# Altium schematic symbol library Minh_Lib.SchLib: 619 symbols (part 1 of 4) (continued)
## C0603C689J5GACTU (continued)
CAP CER 6.8PF 50V C0G/NP0 0603; Manufacturer 1: KEMET; Manufacturer Part Number 1: C0603C689J5GACTU; Category 1: Capacitors; Tolerance: ±5%; Temperature Coefficient: C0G, NP0; Supplier 1: Digi-Key; Supplier Part Number 1: 399-7957-1-ND; RoHS 1: RoHS Compliant; Description 1: CAP CER 6.8PF 50V C0G/NP0 0603; Stock 1: 34264; Pricing 1: 1=0.37, 10=0.25, 100=0.1419, 500=0.10018, 1000=0.08766 (USD); Packaging: Cut Tape (CT); Part Status: Active; Capacitance: 6.8pF; Voltage - Rated: 50V; Operating Temperature: -55°C ~ 125°C; Features: Low ESL; Ratings: -; Applications: General Purpose; Failure Rate: -; Mounting Type: Surface Mount, MLCC; Package / Case: 0603 (1608 Metric); Size / Dimension: 0.063" L x 0.031" W (1.60mm x 0.80mm); Height - Seated (Max): -; Thickness (Max): 0.034" (0.87mm); Lead Spacing: -; Lead Style: -; ComponentLink1URL: http://www.kemet.com/docfinder?Partnumber=C0603C689J5GACTU; ComponentLink1Description: http://www.kemet.com/docfinder?Partnumber=C0603C689J5GACTU; Value: 6.8pF
footprint CAP0603
pins: 1, 2

## C0805C102F4GACTU
designator C?  Supplier Part Number 1: 32X7567
Cap Cer 1000PF 16V NP0 0805 1%; Manufacturer: KEMET; Manufacturer Part Number: C0805C102F4GACTU; Dielectric Material: Ceramic; Capacitance: 1nF; Supplier 1: Newark; RoHS: Yes; Category: Ceramic Capacitors; Pricing 1: 4000=0.41500 (USD); Mount: Surface Mount; Case/Package: 0805; Min Operating Temperature: -55°C; Max Operating Temperature: 125°C; Package Quantity: 4000; Voltage Rating: 16V; Tolerance: 1%; Packaging: Tape and Reel; Voltage Rating (DC): 16V; Length: 0.079inch; Width: 0.049inch; Thickness: 0.035inch; Lead Free: Lead Free; RoHS Compliant: Yes; ComponentLink1URL: https://search.kemet.com/component-edge/download/datasheet/C0805C102F4GACTU.pdf?src-supplier=Digi-Key; ComponentLink1Description: https://search.kemet.com/component-edge/download/datasheet/C0805C102F4GACTU.pdf?src-supplier=Digi-Key
footprint CAP0805
pins: 1, 2

## C0805C102J3RACTU
designator C?  Supplier Part Number 1: 82AC2499
Cap Ceramic 0.001uF 25V X7R 5% SMD 0805 125°C Paper T/R; Manufacturer: KEMET; Manufacturer Part Number: C0805C102J3RACTU; Capacitance: 1nF; Dissipation Factor: 3.5%; Supplier 1: Newark; RoHS: Yes; Category: Ceramic Capacitors; Stock 1: 10688; Pricing 1: 10=0.27200, 25=0.23600, 50=0.19900, 100=0.16300 (USD); Mount: Surface Mount; Case/Package: 0805; Dielectric Material: Ceramic; Case Code (Metric): 2012; Case Code (Imperial): 0805; Min Operating Temperature: -55°C; Max Operating Temperature: 125°C; Tolerance: 5%; Voltage Rating: 25V; Packaging: Tape and Reel; Voltage Rating (DC): 25V; Dielectric: X7R; Series: C; Package Quantity: 4000; Termination: SMD/SMT; Length: 0.079inch; Width: 0.049inch; Height: 0.78mm; Depth: 1.25mm; Thickness: 0.035inch; Lead Pitch: 0.75mm; RoHS Compliant: Yes; ComponentLink1URL: https://datasheet.ciiva.com/5422/kem-c1002-x7r-smd-5422190.pdf?src-supplier=Mouser; ComponentLink1Description: https://datasheet.ciiva.com/5422/kem-c1002-x7r-smd-5422190.pdf?src-supplier=Mouser
footprint CAP0805
pins: 1, 2

## C0805C102J4GACTU
designator C?  Supplier Part Number 1: 96Y7103
Cap Ceramic 0.001uF/1NF/1000PF 16V C0G 5% SMD 0805 125°C Paper T/R; Manufacturer: KEMET; Manufacturer Part Number: C0805C102J4GACTU; Capacitance: 1nF; Supplier 1: Newark; RoHS: Yes; Category: Ceramic Capacitors; Stock 1: 645; Pricing 1: 1=0.32000, 25=0.18500, 50=0.14900, 100=0.11200, 250=0.10700, 500=0.10100 (USD); Mount: Surface Mount; Case/Package: 0805; Case Code (Metric): 2012; Case Code (Imperial): 0805; Dielectric Material: Ceramic; Min Operating Temperature: -55°C; Max Operating Temperature: 125°C; Package Quantity: 1; Voltage Rating: 16V; Tolerance: 5%; Packaging: Tape and Reel; Voltage Rating (DC): 16V; Termination: SMD/SMT; Series: C; Length: 0.079inch; Width: 0.049inch; Thickness: 0.035inch; Lead Free: Lead Free; RoHS Compliant: Yes; ComponentLink1URL: https://datasheet.ciiva.com/5416/kem-c1003-c0g-smd-5416796.pdf?src-supplier=Mouser; ComponentLink1Description: https://datasheet.ciiva.com/5416/kem-c1003-c0g-smd-5416796.pdf?src-supplier=Mouser
footprint CAP0805
pins: 1, 2

## C0805C102J5RACTU
designator C?  Supplier Part Number 1: 36X2687
Multilayer Ceramic Capacitor, C Series,50 V, 1000 pF, - 5%, X7R, 0805 [2012 Metric] ; RoHS Compliant: Yes; Manufacturer: KEMET; Manufacturer Part Number: C0805C102J5RACTU; Capacitance: 1nF; Voltage Rating (DC): 50V; Dissipation Factor: 2.5%; Supplier 1: Newark; RoHS: Yes; Category: Ceramic Capacitors; Stock 1: 16000; Pricing 1: 4000=0.01700, 8000=0.01600 (USD); Mount: Surface Mount,PCB; Case/Package: 0805; Dielectric Material: Ceramic; Case Code (Imperial): 0805; Case Code (Metric): 2012; Min Operating Temperature: -55°C; Max Operating Temperature: 125°C; Tolerance: 5%; Packaging: Tape and Reel; Dielectric: X7R; Package Quantity: 4000; Voltage Rating: 50V; Series: C0805C; Termination: SMD/SMT; Construction: Flat; Voltage: 50V; Length: 2mm; Height: 0.78mm; Depth: 1.25mm; Lead Pitch: 0.75mm; Radiation Hardening: No; REACH SVHC: No SVHC; ComponentLink1URL: https://datasheet.ciiva.com/26847/getdatasheetpartid-304388-26847781.pdf?src-supplier=Verical; ComponentLink1Description: https://datasheet.ciiva.com/26847/getdatasheetpartid-304388-26847781.pdf?src-supplier=Verical; ComponentLink2URL: https://datasheet.ciiva.com/7842/kem-c1002-x7r-smd-7842522.pdf?src-supplier=Element14; ComponentLink2Description: https://datasheet.ciiva.com/7842/kem-c1002-x7r-smd-7842522.pdf?src-supplier=Element14; ComponentLink3URL: https://datasheet.ciiva.com/28672/1851736-28672797.pdf?src-supplier=Element14; ComponentLink3Description: https://datasheet.ciiva.com/28672/1851736-28672797.pdf?src-supplier=Element14
footprint CAP0805
pins: 1, 2

## C0805C102J8HACAUTO
designator C?  Supplier Part Number 1: 80-C0805C102J8HAUTO
Cap Cer 0805 1NF 10V 5% Ultra Stabl; Manufacturer: KEMET; Manufacturer Part Number: C0805C102J8HACAUTO; Supplier 1: Mouser; RoHS: Yes; Category: Ceramic Capacitors; Pricing 1: 1=0.16000, 10=0.11000, 50=0.11000, 100=0.05200, 1000=0.03000, 10000=0.02300 (USD); RoHS Compliant: Yes
footprint CAP0805
pins: 1, 2

## C0805C102K3GACTU
designator C?  Supplier Part Number 1: 80-C0805C102K3G
Cap Ceramic 0.001uF 25V C0G 10% Pad SMD 0805 125C Extreme Low ESR T/R; Manufacturer: KEMET; Manufacturer Part Number: C0805C102K3GACTU; Capacitance: 1nF; Dissipation Factor: 0.1%; Supplier 1: Mouser; RoHS: Yes; Category: Ceramic Capacitors; Stock 1: 2400; Pricing 1: 1=0.38000, 10=0.20600, 50=0.20600, 100=0.12000, 1000=0.10000, 10000=0.08000 (USD); Mount: Surface Mount; Case/Package: 0805; Case Code (Imperial): 0805; Case Code (Metric): 2012; Dielectric Material: Ceramic; Min Operating Temperature: -55°C; Max Operating Temperature: 125°C; Tolerance: 10%; Packaging: Tape and Reel; Package Quantity: 4000; Voltage Rating: 25V; Voltage Rating (DC): 25V; Dielectric: C0G; Termination: SMD/SMT; Series: C; Length: 2mm; Width: 1.2mm; Height: 0.78mm; Thickness: 0.035inch; Depth: 1.25mm; Lead Free: Lead Free; RoHS Compliant: Yes; ComponentLink1URL: https://datasheet.ciiva.com/5414/kem-c1003-c0g-smd-356956-5414092.pdf?src-supplier=Mouser; ComponentLink1Description: https://datasheet.ciiva.com/5414/kem-c1003-c0g-smd-356956-5414092.pdf?src-supplier=Mouser
footprint CAP0805
pins: 1, 2

## C0805C102K4RACTU
designator C?  Supplier Part Number 1: 78H9956
Cap Ceramic 0.001uF 16V X7R 10% SMD 0805 125°C Paper T/R; Manufacturer: KEMET; Manufacturer Part Number: C0805C102K4RACTU; Capacitance: 1nF; Dissipation Factor: 5%; Supplier 1: Newark; RoHS: Yes; Category: Ceramic Capacitors; Stock 1: 4000; Pricing 1: 12000=0.00500 (USD); Mount: Surface Mount; Case/Package: 0805; Case Code (Metric): 2012; Case Code (Imperial): 0805; Dielectric Material: Ceramic; Min Operating Temperature: -55°C; Max Operating Temperature: 125°C; Package Quantity: 1; Voltage Rating: 16V; Tolerance: 10%; Packaging: Tape and Reel; Voltage Rating (DC): 16V; Dielectric: X7R; Termination: SMD/SMT; Series: C; Length: 2mm; Width: 0.049inch; Height: 0.78mm; Thickness: 0.035inch; Lead Pitch: 0.75mm; Depth: 1.25mm; REACH SVHC: No SVHC; RoHS Compliant: Yes; ComponentLink1URL: http://www.farnell.com/datasheets/2746322.pdf?src-supplier=Farnell; ComponentLink1Description: http://www.farnell.com/datasheets/2746322.pdf?src-supplier=Farnell; ComponentLink2URL: http://www.mouser.com/ds/2/212/KEM_C1002_X7R_SMD-1102033.pdf?src-supplier=Mouser; ComponentLink2Description: http://www.mouser.com/ds/2/212/KEM_C1002_X7R_SMD-1102033.pdf?src-supplier=Mouser; ComponentLink3URL: http://components.arrow.com/part/dataview/0323_00324120?src-supplier=Arrow+Europe; ComponentLink3Description: http://components.arrow.com/part/dataview/0323_00324120?src-supplier=Arrow+Europe; ComponentLink4URL: http://www.farnell.com/datasheets/1828800.pdf?src-supplier=Newark; ComponentLink4Description: http://www.farnell.com/datasheets/1828800.pdf?src-supplier=Newark; ComponentLink5URL: https://api.kemet.com/component-edge/download/datasheet/C0805C102K4RACTU.pdf?src-supplier=Digi-Key; ComponentLink5Description: https://api.kemet.com/component-edge/download/datasheet/C0805C102K4RACTU.pdf?src-supplier=Digi-Key; ComponentLink6URL: http://www.farnell.com/datasheets/2746322.pdf?src-supplier=Newark; ComponentLink6Description: http://www.farnell.com/datasheets/2746322.pdf?src-supplier=Newark; ComponentLink7URL: http://capacitoredge.kemet.com/capedge2/DataSheet?pn=C0805C102K4RACTU&src-supplier=Avnet; ComponentLink7Description: http://capacitoredge.kemet.com/capedge2/DataSheet?pn=C0805C102K4RACTU&src-supplier=Avnet
footprint CAP0805
pins: 1, 2

## C0805C102K5GACTU
designator C?  Supplier Part Number 1: 57H7151
Cap Ceramic 0.001uF 50V C0G 10% SMD 0805 125C Plastic T/R; Manufacturer: KEMET; Manufacturer Part Number: C0805C102K5GACTU; Capacitance: 1nF; Dissipation Factor: 0.1%; Supplier 1: Newark; RoHS: Yes; Category: Ceramic Capacitors; Stock 1: 4000; Pricing 1: 12000=0.02100 (USD); Mount: Surface Mount; Case/Package: 0805; Number of Pins: 2; Dielectric Material: Ceramic; Case Code (Metric): 2012; Case Code (Imperial): 0805; Min Operating Temperature: -55°C; Max Operating Temperature: 125°C; Tolerance: 10%; Packaging: Tape and Reel; Voltage Rating (DC): 50V; Dielectric: C0G; Voltage Rating: 50V; Package Quantity: 4000; Termination: SMD/SMT; Series: C0805C; Construction: Flat; Voltage: 50V; Length: 2mm; Width: 0.049inch; Height: 0.78mm; Depth: 1.25mm; Thickness: 0.035inch; Radiation Hardening: No; RoHS Compliant: Yes; REACH SVHC: No SVHC; Lead Free: Lead Free; ComponentLink1URL: https://datasheet.ciiva.com/26948/getdatasheetpartid-385639-26948464.pdf?src-supplier=Verical; ComponentLink1Description: https://datasheet.ciiva.com/26948/getdatasheetpartid-385639-26948464.pdf?src-supplier=Verical; ComponentLink2URL: https://datasheet.ciiva.com/7842/1372242-7842525.pdf?src-supplier=Element14; ComponentLink2Description: https://datasheet.ciiva.com/7842/1372242-7842525.pdf?src-supplier=Element14; ComponentLink3URL: https://datasheet.ciiva.com/7842/1372242-7842524.pdf?src-supplier=Element14; ComponentLink3Description: https://datasheet.ciiva.com/7842/1372242-7842524.pdf?src-supplier=Element14; ComponentLink4URL: https://datasheet.ciiva.com/18193/getdatasheetpartid-120899-18193333.pdf?src-supplier=Verical; ComponentLink4Description: https://datasheet.ciiva.com/18193/getdatasheetpartid-120899-18193333.pdf?src-supplier=Verical
footprint CAP0805
pins: 1, 2

## C0805C102K8RACTU
designator C?  Supplier Part Number 1: 69AC2755
Cap Ceramic 0.001uF 10V X7R 10% SMD 0805 125C Paper T/R; Manufacturer: KEMET; Manufacturer Part Number: C0805C102K8RACTU; Capacitance: 1nF; Supplier 1: Newark; RoHS: Yes; Category: Ceramic Capacitors; Stock 1: 7910; Pricing 1: 10=0.18100, 25=0.15600, 50=0.10800, 100=0.08300 (USD); Mount: Surface Mount; Case/Package: 0805; Case Code (Metric): 2012; Case Code (Imperial): 0805; Contact Plating: Tin,Matte; Dielectric Material: Ceramic; Min Operating Temperature: -55°C; Max Operating Temperature: 125°C; Voltage Rating: 10V; Tolerance: 10%; Packaging: Tape and Reel; Package Quantity: 1; Voltage Rating (DC): 10V; Dielectric: X7R; Termination: SMD/SMT; Series: C; Construction: Flat; Length: 2mm; Width: 0.049inch; Height: 0.78mm; Thickness: 0.035inch; REACH SVHC: No SVHC; RoHS Compliant: Yes; ComponentLink1URL: http://www.mouser.com/ds/2/212/KEM_C1002_X7R_SMD-1102033.pdf?src-supplier=Mouser; ComponentLink1Description: http://www.mouser.com/ds/2/212/KEM_C1002_X7R_SMD-1102033.pdf?src-supplier=Mouser; ComponentLink2URL: https://api.kemet.com/component-edge/download/datasheet/C0805C102K8RACTU.pdf?src-supplier=Digi-Key; ComponentLink2Description: https://api.kemet.com/component-edge/download/datasheet/C0805C102K8RACTU.pdf?src-supplier=Digi-Key; ComponentLink3URL: https://search.kemet.com/component-edge/download/datasheet/C0805C102K8RACTU.pdf?src-supplier=Digi-Key; ComponentLink3Description: https://search.kemet.com/component-edge/download/datasheet/C0805C102K8RACTU.pdf?src-supplier=Digi-Key; ComponentLink4URL: http://www.farnell.com/datasheets/2627200.pdf?src-supplier=Newark; ComponentLink4Description: http://www.farnell.com/datasheets/2627200.pdf?src-supplier=Newark; ComponentLink5URL: http://capacitoredge.kemet.com/capedge2/DataSheet?pn=C0805C102K8RACTU&src-supplier=Avnet; ComponentLink5Description: http://capacitoredge.kemet.com/capedge2/DataSheet?pn=C0805C102K8RACTU&src-supplier=Avnet
footprint CAP0805
pins: 1, 2

## C0805C102K9RACTU
designator C?  Supplier Part Number 1: 32X7575
Ceramic Capacitors  SMD Comm X7R, Ceramic, 1000 pF, 10%, 6.3 VDC, X7R, MLCC; Manufacturer: KEMET; Manufacturer Part Number: C0805C102K9RACTU; Capacitance: 1E-09F; Voltage Rating (DC): 6.3V; Supplier 1: Newark; RoHS: Yes; Category: Capacitors; Pricing 1: 4000=0.02900, 8000=0.02300, 16000=0.01600 (USD); Case/Package: 0805; Dielectric Material: Ceramic; Dielectric: X7R; Tolerance: 10%; RoHS Compliant: Yes; Supplier 2: Mouser
footprint CAP0805
pins: 1, 2

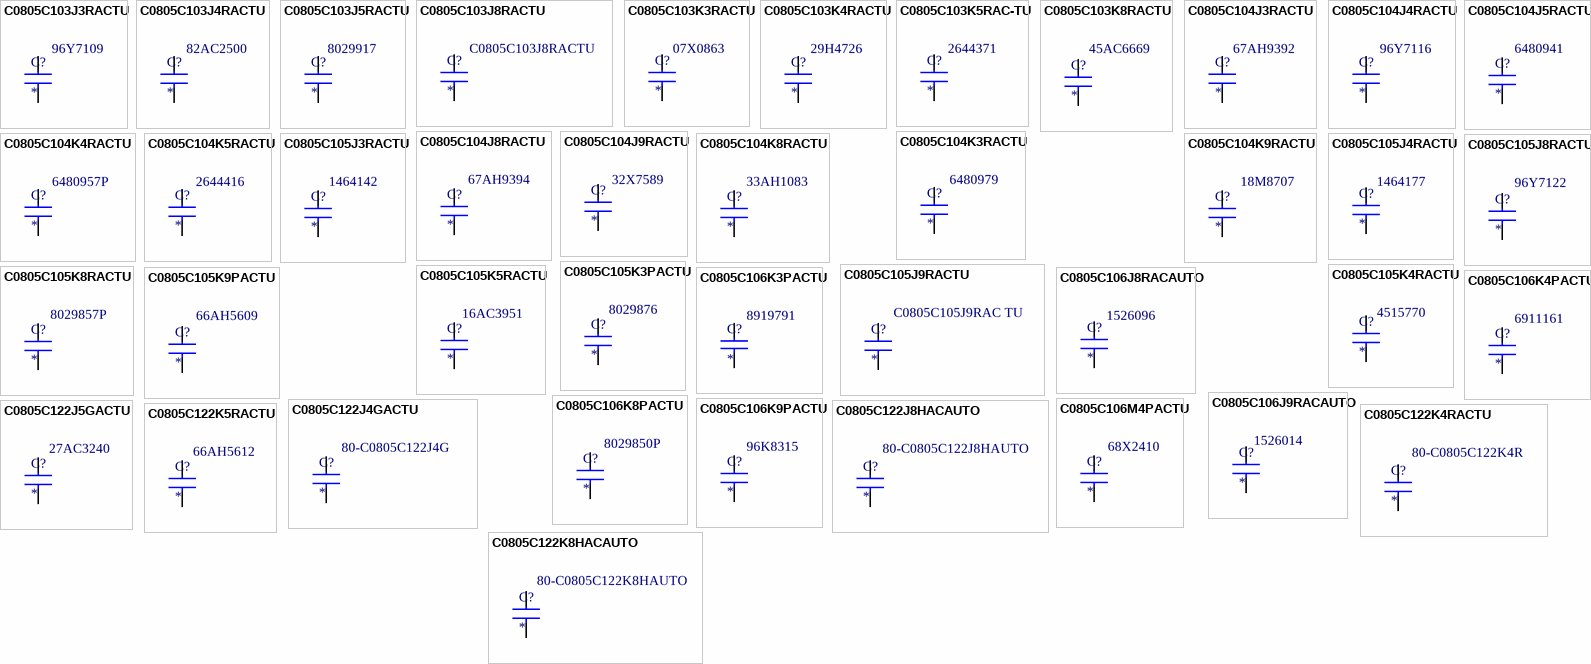
[diagram p1: symbols C0805C103J3RACTU to C0805C122K8HACAUTO]

## C0805C103J3RACTU
designator C?  Supplier Part Number 1: 96Y7109
Cap Ceramic 0.01uF 25V X7R 5% SMD 0805 125°C Plastic T/R; Manufacturer: KEMET; Manufacturer Part Number: C0805C103J3RACTU; Capacitance: 10nF; Supplier 1: Newark; RoHS: Yes; Category: Ceramic Capacitors; Stock 1: 123; Pricing 1: 1=0.01900, 25=0.01900, 50=0.01900, 100=0.01900, 250=0.01900, 500=0.01900, 1000=0.01900 (USD); Mount: Surface Mount; Case/Package: 0805; Dielectric Material: Ceramic; Case Code (Metric): 2012; Case Code (Imperial): 0805; Min Operating Temperature: -55°C; Max Operating Temperature: 125°C; Tolerance: 5%; Voltage Rating (DC): 25V; Dielectric: X7R; Package Quantity: 1; Voltage Rating: 25V; Packaging: Tape and Reel; Termination: SMD/SMT; Series: C; Length: 2mm; Width: 0.049inch; Height: 0.78mm; Depth: 1.25mm; Thickness: 0.035inch; Lead Pitch: 0.75mm; RoHS Compliant: Yes; ComponentLink1URL: http://www.mouser.com/ds/2/212/KEM_C1002_X7R_SMD-1102033.pdf?src-supplier=Mouser; ComponentLink1Description: http://www.mouser.com/ds/2/212/KEM_C1002_X7R_SMD-1102033.pdf?src-supplier=Mouser; ComponentLink2URL: http://www.farnell.com/datasheets/2750074.pdf?src-supplier=Farnell; ComponentLink2Description: http://www.farnell.com/datasheets/2750074.pdf?src-supplier=Farnell; ComponentLink3URL: http://components.arrow.com/part/dataview/2091049S8993834N7429?src-supplier=Arrow+Electronics; ComponentLink3Description: http://components.arrow.com/part/dataview/2091049S8993834N7429?src-supplier=Arrow+Electronics; ComponentLink4URL: https://api.kemet.com/component-edge/download/datasheet/C0805C103J3RACTU.pdf?src-supplier=Digi-Key; ComponentLink4Description: https://api.kemet.com/component-edge/download/datasheet/C0805C103J3RACTU.pdf?src-supplier=Digi-Key; ComponentLink5URL: http://www.farnell.com/datasheets/2750074.pdf?src-supplier=Newark; ComponentLink5Description: http://www.farnell.com/datasheets/2750074.pdf?src-supplier=Newark
footprint CAP0805
pins: 1, 2

## C0805C103J4RACTU
designator C?  Supplier Part Number 1: 82AC2500
Cap Ceramic 0.01uF 16V X7R 5% SMD 0805 125°C Paper T/R; Manufacturer: KEMET; Manufacturer Part Number: C0805C103J4RACTU; Capacitance: 10nF; Supplier 1: Newark; RoHS: Yes; Category: Ceramic Capacitors; Stock 1: 3249; Pricing 1: 10=0.34000, 25=0.29500, 50=0.25000, 100=0.20500 (USD); Mount: Surface Mount; Case/Package: 0805; Case Code (Imperial): 0805; Case Code (Metric): 2012; Dielectric Material: Ceramic; Min Operating Temperature: -55°C; Max Operating Temperature: 125°C; Package Quantity: 4000; Tolerance: 5%; Packaging: Tape and Reel; Voltage Rating: 16V; Voltage Rating (DC): 16V; Dielectric: X7R; Termination: SMD/SMT; Dissipation Factor: 5%; Series: C; Construction: Flat; Length: 2mm; Width: 1.2mm; Height: 0.78mm; Lead Pitch: 0.75mm; Thickness: 0.035inch; Depth: 1.25mm; RoHS Compliant: Yes; ComponentLink1URL: http://www.mouser.com/ds/2/212/KEM_C1002_X7R_SMD-1102033.pdf?src-supplier=Mouser; ComponentLink1Description: http://www.mouser.com/ds/2/212/KEM_C1002_X7R_SMD-1102033.pdf?src-supplier=Mouser; ComponentLink2URL: http://www.farnell.com/datasheets/2744318.pdf?src-supplier=Farnell; ComponentLink2Description: http://www.farnell.com/datasheets/2744318.pdf?src-supplier=Farnell; ComponentLink3URL: http://www.farnell.com/datasheets/2744318.pdf?src-supplier=Element14; ComponentLink3Description: http://www.farnell.com/datasheets/2744318.pdf?src-supplier=Element14; ComponentLink4URL: http://www.kemet.com/docfinder?Partnumber=C0805C103J4RACTU&src-supplier=Digi-Key; ComponentLink4Description: http://www.kemet.com/docfinder?Partnumber=C0805C103J4RACTU&src-supplier=Digi-Key; ComponentLink5URL: http://capacitoredge.kemet.com/capedge2/DataSheet?pn=C0805C103J4RACTU&src-supplier=Avnet; ComponentLink5Description: http://capacitoredge.kemet.com/capedge2/DataSheet?pn=C0805C103J4RACTU&src-supplier=Avnet
footprint CAP0805
pins: 1, 2

## C0805C103J5RACTU
designator C?  Supplier Part Number 1: 8029917
Cap Ceramic 0.01uF 50V X7R 5% SMD 0805 125°C Paper T/R; Manufacturer: KEMET; Manufacturer Part Number: C0805C103J5RACTU; Capacitance: 10nF; Dissipation Factor: 10%; Supplier 1: RSComponents; RoHS: Yes; Category: Ceramic Capacitors; Stock 1: 12500; Pricing 1: 500=0.02200, 2500=0.01500 (USD); Mount: Surface Mount; Case/Package: 0805; Number of Pins: 2; Case Code (Imperial): 0805; Case Code (Metric): 2012; Dielectric Material: Ceramic; Contact Plating: Tin,Matte; Min Operating Temperature: -55°C; Max Operating Temperature: 125°C; Tolerance: 5%; Packaging: Tape and Reel; Dielectric: X7R; Voltage Rating (DC): 50V; Voltage Rating: 50V; Termination: SMD/SMT; Series: C0805C; Package Quantity: 4000; Voltage: 50V; Construction: Flat; Length: 2mm; Width: 1.2mm; Height: 0.78mm; Depth: 1.25mm; Lead Pitch: 0.75mm; Thickness: 0.035inch; Radiation Hardening: No; RoHS Compliant: Yes; REACH SVHC: No SVHC; ComponentLink1URL: https://datasheet.ciiva.com/29540/c0805c103j5ractu-29540182.pdf?src-supplier=Digi-Key; ComponentLink1Description: https://datasheet.ciiva.com/29540/c0805c103j5ractu-29540182.pdf?src-supplier=Digi-Key; ComponentLink2URL: https://datasheet.ciiva.com/18193/getdatasheetpartid-330694-18193366.pdf?src-supplier=Verical; ComponentLink2Description: https://datasheet.ciiva.com/18193/getdatasheetpartid-330694-18193366.pdf?src-supplier=Verical
footprint CAP0805
pins: 1, 2

## C0805C103J8RACTU
designator C?  Supplier Part Number 1: C0805C103J8RACTU
Ceramic Capacitors -  SMD, 0.01 uF, 5%, 10 VDC, X7R, SMD, MLCC, Temperature Stable, Class II, 0805; Manufacturer: KEMET; Capacitance: 10nF; Voltage Rating: 10V; Supplier 1: Avnet; Manufacturer Part Number: C0805C103J8RACTU; RoHS: Yes; Category: Ceramic Capacitors; Stock 1: 4000; Pricing 1: 4000=0.08410, 8000=0.08265, 16000=0.08120, 24000=0.07975, 32000=0.07830, 40000=0.07685, 400000=0.07540 (USD); Mount: Surface Mount; Case/Package: 0805; Dielectric Material: Ceramic; Min Operating Temperature: -55°C; Max Operating Temperature: 125°C; Tolerance: 5%; Packaging: Tape and Reel; Dielectric: X7R; Voltage Rating (DC): 10V; Package Quantity: 4000; Series: C; Construction: Flat; Length: 0.079inch; Width: 0.049inch; Height: 0.78mm; Thickness: 0.035inch; Depth: 1.25mm; RoHS Compliant: Yes; ComponentLink1URL: https://search.kemet.com/component-edge/download/datasheet/C0805C103J8RACTU.pdf?src-supplier=Digi-Key; ComponentLink1Description: https://search.kemet.com/component-edge/download/datasheet/C0805C103J8RACTU.pdf?src-supplier=Digi-Key
footprint CAP0805
pins: 1, 2

## C0805C103K3RACTU
designator C?  Supplier Part Number 1: 07X0863
Cap Ceramic 0.01uF 25V X7R 10% SMD 0805 125°C Paper T/R; Manufacturer: KEMET; Manufacturer Part Number: C0805C103K3RACTU; Capacitance: 10nF; Dissipation Factor: 3.5%; Supplier 1: Newark; RoHS: Yes; Category: Ceramic Capacitors; Stock 1: 288; Pricing 1: 1=0.22800, 25=0.13400, 50=0.10600, 100=0.07800, 250=0.06600, 500=0.05500, 1000=0.04600 (USD); Mount: Surface Mount; Case/Package: 0805; Case Code (Metric): 2012; Case Code (Imperial): 0805; Dielectric Material: Ceramic; Min Operating Temperature: -55°C; Max Operating Temperature: 125°C; Tolerance: 10%; Packaging: Tape and Reel; Voltage Rating (DC): 25V; Package Quantity: 1; Voltage Rating: 25V; Termination: SMD/SMT; Series: C; Dielectric: X7R; Construction: Flat; Length: 2mm; Width: 0.049inch; Height: 0.78mm; Thickness: 0.035inch; Depth: 1.25mm; Lead Pitch: 0.75mm; Radiation Hardening: No; RoHS Compliant: Yes; REACH SVHC: No SVHC; ComponentLink1URL: https://www.verical.com/server-webapp/html/getDatasheet?partID=697850&src-supplier=Verical; ComponentLink1Description: https://www.verical.com/server-webapp/html/getDatasheet?partID=697850&src-supplier=Verical; ComponentLink2URL: http://www.farnell.com/datasheets/2746089.pdf?src-supplier=Farnell; ComponentLink2Description: http://www.farnell.com/datasheets/2746089.pdf?src-supplier=Farnell; ComponentLink3URL: http://components.arrow.com/part/dataview/0323_00325063?src-supplier=Arrow+Europe; ComponentLink3Description: http://components.arrow.com/part/dataview/0323_00325063?src-supplier=Arrow+Europe; ComponentLink4URL: http://www.farnell.com/datasheets/2315422.pdf?src-supplier=Farnell; ComponentLink4Description: http://www.farnell.com/datasheets/2315422.pdf?src-supplier=Farnell; ComponentLink5URL: http://www.mouser.com/ds/2/212/KEM_C1002_X7R_SMD-1102033.pdf?src-supplier=Mouser; ComponentLink5Description: http://www.mouser.com/ds/2/212/KEM_C1002_X7R_SMD-1102033.pdf?src-supplier=Mouser; ComponentLink6URL: http://www.jameco.com/Jameco/Products/ProdDS/1637716.pdf?src-supplier=Jameco; ComponentLink6Description: http://www.jameco.com/Jameco/Products/ProdDS/1637716.pdf?src-supplier=Jameco; ComponentLink7URL: http://components.arrow.com/part/dataview/2091057S98063N7429?src-supplier=Arrow+Electronics; ComponentLink7Description: http://components.arrow.com/part/dataview/2091057S98063N7429?src-supplier=Arrow+Electronics; ComponentLink8URL: https://api.kemet.com/component-edge/download/datasheet/C0805C103K3RACTU.pdf?src-supplier=Digi-Key; ComponentLink8Description: https://api.kemet.com/component-edge/download/datasheet/C0805C103K3RACTU.pdf?src-supplier=Digi-Key; ComponentLink9URL: https://search.kemet.com/component-edge/download/datasheet/C0805C103K3RACTU.pdf?src-supplier=Digi-Key; ComponentLink9Description: https://search.kemet.com/component-edge/download/datasheet/C0805C103K3RACTU.pdf?src-supplier=Digi-Key; ComponentLink10URL: http://www.farnell.com/datasheets/2746089.pdf?src-supplier=Newark; ComponentLink10Description: http://www.farnell.com/datasheets/2746089.pdf?src-supplier=Newark; ComponentLink11URL: http://www.farnell.com/datasheets/2064982.pdf?src-supplier=Element14; ComponentLink11Description: http://www.farnell.com/datasheets/2064982.pdf?src-supplier=Element14; ComponentLink12URL: http://capacitoredge.kemet.com/capedge2/DataSheet?pn=C0805C103K3RACTU&src-supplier=Avnet; ComponentLink12Description: http://capacitoredge.kemet.com/capedge2/DataSheet?pn=C0805C103K3RACTU&src-supplier=Avnet
footprint CAP0805
pins: 1, 2

## C0805C103K4RACTU
designator C?  Supplier Part Number 1: 29H4726
Cap Ceramic 0.01uF 16V X7R 10% SMD 0805 125°C Paper T/R; Manufacturer: KEMET; Manufacturer Part Number: C0805C103K4RACTU; Capacitance: 10nF; Supplier 1: Newark; RoHS: Yes; Category: Ceramic Capacitors; Stock 1: 8000; Pricing 1: 1=0.03500, 4000=0.03400, 8000=0.03100 (USD); Mount: Surface Mount; Case/Package: 0805; Case Code (Metric): 2012; Case Code (Imperial): 0805; Dielectric Material: Ceramic; Min Operating Temperature: -55°C; Max Operating Temperature: 125°C; Package Quantity: 1; Voltage Rating: 16V; Tolerance: 10%; Packaging: Tape and Reel; Voltage Rating (DC): 16V; Dielectric: X7R; Termination: SMD/SMT; Length: 2mm; Width: 0.049inch; Height: 0.78mm; Thickness: 0.035inch; Lead Pitch: 0.75mm; Depth: 1.25mm; Radiation Hardening: No; REACH SVHC: No SVHC; ComponentLink1URL: http://components.arrow.com/part/dataview/0323_00325260?src-supplier=Arrow+Europe; ComponentLink1Description: http://components.arrow.com/part/dataview/0323_00325260?src-supplier=Arrow+Europe; ComponentLink2URL: http://www.farnell.com/datasheets/2746090.pdf?src-supplier=Farnell; ComponentLink2Description: http://www.farnell.com/datasheets/2746090.pdf?src-supplier=Farnell; ComponentLink3URL: http://www.mouser.com/ds/2/212/KEM_C1002_X7R_SMD-1102033.pdf?src-supplier=Mouser; ComponentLink3Description: http://www.mouser.com/ds/2/212/KEM_C1002_X7R_SMD-1102033.pdf?src-supplier=Mouser; ComponentLink4URL: https://api.kemet.com/component-edge/download/datasheet/C0805C103K4RACTU.pdf?src-supplier=Digi-Key; ComponentLink4Description: https://api.kemet.com/component-edge/download/datasheet/C0805C103K4RACTU.pdf?src-supplier=Digi-Key; ComponentLink5URL: http://www.farnell.com/datasheets/1791936.pdf?src-supplier=Newark; ComponentLink5Description: http://www.farnell.com/datasheets/1791936.pdf?src-supplier=Newark; ComponentLink6URL: http://www.farnell.com/datasheets/2746090.pdf?src-supplier=Newark; ComponentLink6Description: http://www.farnell.com/datasheets/2746090.pdf?src-supplier=Newark; ComponentLink7URL: http://www.farnell.com/datasheets/2064983.pdf?src-supplier=Element14; ComponentLink7Description: http://www.farnell.com/datasheets/2064983.pdf?src-supplier=Element14; ComponentLink8URL: http://components.arrow.com/part/dataview/3450723S5469568N7429?src-supplier=Arrow+Electronics; ComponentLink8Description: http://components.arrow.com/part/dataview/3450723S5469568N7429?src-supplier=Arrow+Electronics
footprint CAP0805
pins: 1, 2

## C0805C103K5RAC-TU
designator C?  Supplier Part Number 1: 2644371
Cap Ceramic 0.01uF 50V X7R 10% SMD 0805 125C Plastic T/R; Manufacturer: KEMET; Manufacturer Part Number: C0805C103K5RAC-TU; Capacitance: 10nF; Supplier 1: RSComponents; RoHS: Yes; Category: Ceramic Capacitors; Stock 1: 8800; Pricing 1: 25=0.14100, 100=0.13200, 250=0.12100, 500=0.11400, 1250=0.10500 (USD); Mount: PCB,Surface Mount; Case/Package: 0805; Number of Pins: 2; Case Code (Metric): 2012; Case Code (Imperial): 0805; Dielectric Material: Ceramic; Min Operating Temperature: -55°C; Max Operating Temperature: 125°C; Voltage Rating (DC): 50V; Tolerance: 10%; Packaging: Tape and Reel; Dielectric: X7R; Termination: SMD/SMT; Package Quantity: 4000; Voltage Rating: 50V; Series: C0805C; Construction: Flat; Voltage: 50V; Length: 2mm; Width: 1.2mm; Height: 0.78mm; Depth: 1.25mm; Thickness: 0.035inch; Lead Pitch: 0.75mm; Radiation Hardening: No; REACH SVHC: No SVHC; ComponentLink1URL: https://datasheet.ciiva.com/7172/1828800-7172412.pdf?src-supplier=Newark; ComponentLink1Description: https://datasheet.ciiva.com/7172/1828800-7172412.pdf?src-supplier=Newark; ComponentLink2URL: https://datasheet.ciiva.com/5904/kem-c1002-x7r-smd-5904709.pdf?src-supplier=Farnell; ComponentLink2Description: https://datasheet.ciiva.com/5904/kem-c1002-x7r-smd-5904709.pdf?src-supplier=Farnell; ComponentLink3URL: https://datasheet.ciiva.com/7842/kem-c1002-x7r-smd-7842533.pdf?src-supplier=Element14; ComponentLink3Description: https://datasheet.ciiva.com/7842/kem-c1002-x7r-smd-7842533.pdf?src-supplier=Element14; ComponentLink4URL: https://datasheet.ciiva.com/28672/1851736-28672830.pdf?src-supplier=Element14; ComponentLink4Description: https://datasheet.ciiva.com/28672/1851736-28672830.pdf?src-supplier=Element14; ComponentLink5URL: https://datasheet.ciiva.com/26923/getdatasheetpartid-759674-26923957.pdf?src-supplier=Verical; ComponentLink5Description: https://datasheet.ciiva.com/26923/getdatasheetpartid-759674-26923957.pdf?src-supplier=Verical; ComponentLink6URL: https://datasheet.ciiva.com/39122/docfinderpartnumberc0402c102k5ractu-39122923.pdf?src-supplier=Onlinecomponents.com; ComponentLink6Description: https://datasheet.ciiva.com/39122/docfinderpartnumberc0402c102k5ractu-39122923.pdf?src-supplier=Onlinecomponents.com
footprint CAP0805
pins: 1, 2

## C0805C103K8RACTU
designator C?  Supplier Part Number 1: 45AC6669
Ceramic Capacitors - SMD 10V 0.01uF X7R 0805 10%; Manufacturer: KEMET; Manufacturer Part Number: C0805C103K8RACTU; Capacitance: 10nF; Supplier 1: Newark; RoHS: Yes; Category: Ceramic Capacitors; Stock 1: 1309; Pricing 1: 10=0.15000, 25=0.12500, 50=0.10000, 100=0.07500, 250=0.06500, 500=0.05400, 1000=0.04500 (USD); Mount: Surface Mount; Case/Package: 0805; Case Code (Metric): 2012; Case Code (Imperial): 0805; Dielectric Material: Ceramic; Min Operating Temperature: -55°C; Max Operating Temperature: 125°C; Tolerance: 10%; Packaging: Tape and Reel; Package Quantity: 4000; Voltage Rating: 10V; Voltage Rating (DC): 10V; Dielectric: X7R; Termination: SMD/SMT; Series: C; Length: 2mm; Width: 0.049inch; Height: 0.78mm; Thickness: 0.035inch; Lead Pitch: 0.75mm; Depth: 1.25mm; RoHS Compliant: Yes; ComponentLink1URL: https://datasheet.ciiva.com/5422/kem-c1002-x7r-smd-357932-5422870.pdf?src-supplier=Mouser; ComponentLink1Description: https://datasheet.ciiva.com/5422/kem-c1002-x7r-smd-357932-5422870.pdf?src-supplier=Mouser
footprint CAP0805
pins: 1, 2

## C0805C104J3RACTU
designator C?  Supplier Part Number 1: 67AH9392
Cap Ceramic 0.1uF 25V X7R 5% SMD 0805 125C Plastic T/R; Manufacturer: KEMET; Manufacturer Part Number: C0805C104J3RACTU; Capacitance: 100nF; Dissipation Factor: 3.5%; Supplier 1: Newark; RoHS: Yes; Category: Ceramic Capacitors; Stock 1: 8000; Pricing 1: 4000=0.06700, 8000=0.05500, 16000=0.04800, 24000=0.04400, 40000=0.03900 (USD); Mount: Surface Mount; Case/Package: 0805; Dielectric Material: Ceramic; Case Code (Metric): 2012; Case Code (Imperial): 0805; Contact Plating: Tin,Matte; Min Operating Temperature: -55°C; Max Operating Temperature: 125°C; Tolerance: 5%; Dielectric: X7R; Packaging: Tape and Reel; Voltage Rating: 25V; Voltage Rating (DC): 25V; Package Quantity: 4000; Termination: SMD/SMT; Series: C; Length: 2mm; Width: 0.049inch; Height: 0.9mm; Depth: 1.25mm; Lead Pitch: 0.75mm; Thickness: 0.035inch; RoHS Compliant: Yes; ComponentLink1URL: http://www.mouser.com/ds/2/212/KEM_C1002_X7R_SMD-1102033.pdf?src-supplier=Mouser; ComponentLink1Description: http://www.mouser.com/ds/2/212/KEM_C1002_X7R_SMD-1102033.pdf?src-supplier=Mouser; ComponentLink2URL: http://www.farnell.com/datasheets/2746325.pdf?src-supplier=Farnell; ComponentLink2Description: http://www.farnell.com/datasheets/2746325.pdf?src-supplier=Farnell; ComponentLink3URL: http://components.arrow.com/part/dataview/0323_00325468?src-supplier=Arrow+Europe; ComponentLink3Description: http://components.arrow.com/part/dataview/0323_00325468?src-supplier=Arrow+Europe; ComponentLink4URL: http://components.arrow.com/part/dataview/2091081S3491311N7429?src-supplier=Arrow+Electronics; ComponentLink4Description: http://components.arrow.com/part/dataview/2091081S3491311N7429?src-supplier=Arrow+Electronics; ComponentLink5URL: https://api.kemet.com/component-edge/download/datasheet/C0805C104J3RACTU.pdf?src-supplier=Digi-Key; ComponentLink5Description: https://api.kemet.com/component-edge/download/datasheet/C0805C104J3RACTU.pdf?src-supplier=Digi-Key; ComponentLink6URL: http://capacitoredge.kemet.com/capedge2/DataSheet?pn=C0805C104J3RACTU&src-supplier=Avnet; ComponentLink6Description: http://capacitoredge.kemet.com/capedge2/DataSheet?pn=C0805C104J3RACTU&src-supplier=Avnet; ComponentLink7URL: http://capacitoredge.kemet.com/capedge2/DataSheet?pn=C0805C104J3RACTU&src-supplier=Avnet+Asia; ComponentLink7Description: http://capacitoredge.kemet.com/capedge2/DataSheet?pn=C0805C104J3RACTU&src-supplier=Avnet+Asia; ComponentLink8URL: http://www.farnell.com/datasheets/2746325.pdf?src-supplier=Newark; ComponentLink8Description: http://www.farnell.com/datasheets/2746325.pdf?src-supplier=Newark
footprint CAP0805
pins: 1, 2

## C0805C104J4RACTU
designator C?  Supplier Part Number 1: 96Y7116
Cap Ceramic 0.1uF 16V X7R 5% SMD 0805 125°C Plastic T/R; Manufacturer: KEMET; Manufacturer Part Number: C0805C104J4RACTU; Capacitance: 100nF; Supplier 1: Newark; RoHS: Yes; Category: Ceramic Capacitors; Stock 1: 687; Pricing 1: 1=0.98500, 25=0.63900, 50=0.51600, 100=0.39500, 250=0.37800, 500=0.36000, 1000=0.33300 (USD); Mount: Surface Mount; Case/Package: 0805; Dielectric Material: Ceramic; Case Code (Imperial): 0805; Case Code (Metric): 2012; Min Operating Temperature: -55°C; Max Operating Temperature: 125°C; Tolerance: 5%; Packaging: Tape and Reel; Voltage Rating: 16V; Package Quantity: 4000; Voltage Rating (DC): 16V; Dielectric: X7R; Termination: SMD/SMT; Dissipation Factor: 5%; Series: -; Length: 2mm; Width: 1.2mm; Height: 0.9mm; Thickness: 0.035inch; Depth: 1.25mm; Lead Pitch: 0.75mm; RoHS Compliant: Yes; ComponentLink1URL: http://www.mouser.com/ds/2/212/KEM_C1002_X7R_SMD-1102033.pdf?src-supplier=Mouser; ComponentLink1Description: http://www.mouser.com/ds/2/212/KEM_C1002_X7R_SMD-1102033.pdf?src-supplier=Mouser; ComponentLink2URL: http://www.farnell.com/datasheets/2746326.pdf?src-supplier=Farnell; ComponentLink2Description: http://www.farnell.com/datasheets/2746326.pdf?src-supplier=Farnell; ComponentLink3URL: http://components.arrow.com/part/dataview/0323_00325571?src-supplier=Arrow+Europe; ComponentLink3Description: http://components.arrow.com/part/dataview/0323_00325571?src-supplier=Arrow+Europe; ComponentLink4URL: http://www.farnell.com/datasheets/2323359.pdf?src-supplier=Farnell; ComponentLink4Description: http://www.farnell.com/datasheets/2323359.pdf?src-supplier=Farnell; ComponentLink5URL: http://components.arrow.com/part/dataview/3452184S4481915N7429?src-supplier=Arrow+Electronics; ComponentLink5Description: http://components.arrow.com/part/dataview/3452184S4481915N7429?src-supplier=Arrow+Electronics; ComponentLink6URL: http://www.farnell.com/datasheets/2746326.pdf?src-supplier=Newark; ComponentLink6Description: http://www.farnell.com/datasheets/2746326.pdf?src-supplier=Newark; ComponentLink7URL: http://www.farnell.com/datasheets/2330568.pdf?src-supplier=Newark; ComponentLink7Description: http://www.farnell.com/datasheets/2330568.pdf?src-supplier=Newark; ComponentLink8URL: https://api.kemet.com/component-edge/download/datasheet/C0805C104J4RACTU.pdf?src-supplier=Digi-Key; ComponentLink8Description: https://api.kemet.com/component-edge/download/datasheet/C0805C104J4RACTU.pdf?src-supplier=Digi-Key
footprint CAP0805
pins: 1, 2

## C0805C104J5RACTU
designator C?  Supplier Part Number 1: 6480941
Ceramic Capacitors MLCC - SMD/SMT 50V 0.1uF X7R 0805 5%; Manufacturer: KEMET; Manufacturer Part Number: C0805C104J5RACTU; Capacitance: 100nF; Supplier 1: RSComponents; RoHS: Yes; Category: Ceramic Capacitors; Stock 1: 9590; Pricing 1: 10=0.23500, 100=0.22200, 250=0.20700, 500=0.19500, 1000=0.17600 (USD); Mount: Surface Mount,PCB; Case/Package: 0805; Number of Pins: 2; Dielectric Material: Ceramic; Case Code (Metric): 2012; Case Code (Imperial): 0805; Contact Plating: Tin,Matte; Min Operating Temperature: -55°C; Max Operating Temperature: 125°C; Tolerance: 5%; Voltage Rating (DC): 50V; Dielectric: X7R; Packaging: Tape and Reel; Voltage Rating: 50V; Package Quantity: 1; Termination: SMD/SMT; Series: C; Construction: Flat; Voltage: 50V; Length: 2mm; Width: 0.049inch; Height: 0.9mm; Depth: 1.25mm; Thickness: 0.035inch; Lead Pitch: 0.75mm; Radiation Hardening: No; RoHS Compliant: Yes; REACH SVHC: No SVHC; ComponentLink1URL: https://datasheet.ciiva.com/7842/1732721-7842179.pdf?src-supplier=Element14; ComponentLink1Description: https://datasheet.ciiva.com/7842/1732721-7842179.pdf?src-supplier=Element14; ComponentLink2URL: https://datasheet.ciiva.com/28682/1851736-28682223.pdf?src-supplier=Element14; ComponentLink2Description: https://datasheet.ciiva.com/28682/1851736-28682223.pdf?src-supplier=Element14; ComponentLink3URL: https://datasheet.ciiva.com/7258/1828800-7258413.pdf?src-supplier=Newark; ComponentLink3Description: https://datasheet.ciiva.com/7258/1828800-7258413.pdf?src-supplier=Newark; ComponentLink4URL: https://datasheet.ciiva.com/14589/70095383-14589015.pdf?src-supplier=Allied+Electronics; ComponentLink4Description: https://datasheet.ciiva.com/14589/70095383-14589015.pdf?src-supplier=Allied+Electronics; ComponentLink5URL: https://datasheet.ciiva.com/5417/kem-c1002-x7r-smd-5417352.pdf?src-supplier=Mouser; ComponentLink5Description: https://datasheet.ciiva.com/5417/kem-c1002-x7r-smd-5417352.pdf?src-supplier=Mouser; ComponentLink6URL: https://datasheet.ciiva.com/39122/docfinderpartnumberc0402c102k5ractu-39122924.pdf?src-supplier=Onlinecomponents.com; ComponentLink6Description: https://datasheet.ciiva.com/39122/docfinderpartnumberc0402c102k5ractu-39122924.pdf?src-supplier=Onlinecomponents.com
footprint CAP0805
pins: 1, 2

## C0805C104J8RACTU
designator C?  Supplier Part Number 1: 67AH9394
Ceramic Capacitors MLCC - SMD/SMT 10V 0.1uF X7R 0805 5%; Manufacturer: KEMET; Manufacturer Part Number: C0805C104J8RACTU; Capacitance: 100nF; Supplier 1: Newark; RoHS: Yes; Category: Ceramic Capacitors; Stock 1: 12000; Pricing 1: 4000=0.13400 (USD); Mount: Surface Mount; Case/Package: 0805; Dielectric Material: Ceramic; Case Code (Metric): 2012; Case Code (Imperial): 0805; Min Operating Temperature: -55°C; Max Operating Temperature: 125°C; Tolerance: 5%; Packaging: Tape and Reel; Voltage Rating: 10V; Voltage Rating (DC): 10V; Package Quantity: 1; Dielectric: X7R; Termination: SMD/SMT; Series: C; Construction: Flat; Length: 2mm; Width: 0.049inch; Height: 0.9mm; Thickness: 0.035inch; Depth: 1.25mm; Lead Pitch: 0.75mm; Radiation Hardening: No; RoHS Compliant: Yes; REACH SVHC: No SVHC; ComponentLink1URL: http://www.farnell.com/datasheets/2552466.pdf?src-supplier=Farnell; ComponentLink1Description: http://www.farnell.com/datasheets/2552466.pdf?src-supplier=Farnell; ComponentLink2URL: http://www.mouser.com/ds/2/212/KEM_C1002_X7R_SMD-1102033.pdf?src-supplier=Mouser; ComponentLink2Description: http://www.mouser.com/ds/2/212/KEM_C1002_X7R_SMD-1102033.pdf?src-supplier=Mouser; ComponentLink3URL: http://components.arrow.com/part/dataview/0323_00324287?src-supplier=Arrow+Europe; ComponentLink3Description: http://components.arrow.com/part/dataview/0323_00324287?src-supplier=Arrow+Europe; ComponentLink4URL: https://api.kemet.com/component-edge/download/datasheet/C0805C104J8RACTU.pdf?src-supplier=Digi-Key; ComponentLink4Description: https://api.kemet.com/component-edge/download/datasheet/C0805C104J8RACTU.pdf?src-supplier=Digi-Key; ComponentLink5URL: https://search.kemet.com/component-edge/download/datasheet/C0805C104J8RACTU.pdf?src-supplier=Digi-Key; ComponentLink5Description: https://search.kemet.com/component-edge/download/datasheet/C0805C104J8RACTU.pdf?src-supplier=Digi-Key; ComponentLink6URL: http://capacitoredge.kemet.com/capedge2/DataSheet?pn=C0805C104J8RACTU&src-supplier=Avnet; ComponentLink6Description: http://capacitoredge.kemet.com/capedge2/DataSheet?pn=C0805C104J8RACTU&src-supplier=Avnet
footprint CAP0805
pins: 1, 2

## C0805C104J9RACTU
designator C?  Supplier Part Number 1: 32X7589
Ceramic Capacitors   SMD Comm X7R, 0.1 uF, 5%, 6.3 VDC, X7R, MLCC, Temperature Stable, Class II, 0805; Manufacturer: KEMET; Manufacturer Part Number: C0805C104J9RACTU; Capacitance: 0.0001F; Supplier 1: Newark; RoHS: Yes; Category: Capacitors; Pricing 1: 4000=0.18400, 8000=0.16000, 16000=0.14300, 24000=0.13100, 40000=0.12000 (USD); RoHS Compliant: Yes
footprint CAP0805
pins: 1, 2

## C0805C104K3RACTU
designator C?  Supplier Part Number 1: 6480979
Cap Ceramic 0.1uF 25V X7R 10% SMD 0805 125C Plastic T/R; Manufacturer: KEMET; Manufacturer Part Number: C0805C104K3RACTU; Capacitance: 100nF; Supplier 1: RSComponents; RoHS: Yes; Category: Ceramic Capacitors; Stock 1: 1910; Pricing 1: 10=0.13300, 100=0.12200, 250=0.11000, 500=0.09400, 1000=0.08300 (USD); Mount: PCB,Surface Mount; Case/Package: 0805; Dielectric Material: Ceramic; Case Code (Imperial): 0805; Case Code (Metric): 2012; Contact Plating: Tin,Matte; Min Operating Temperature: -55°C; Max Operating Temperature: 125°C; Tolerance: 10%; Dielectric: X7R; Packaging: Tape and Reel; Voltage Rating (DC): 25V; Package Quantity: 4000; Voltage Rating: 25V; Termination: SMD/SMT; Series: C0805C; Construction: Flat; Voltage: 25V; Length: 2mm; Width: 1.2mm; Height: 0.9mm; Depth: 1.25mm; Lead Pitch: 0.75mm; Radiation Hardening: No; RoHS Compliant: Yes; ComponentLink1URL: https://datasheet.ciiva.com/18193/getdatasheetpartid-385649-18193413.pdf?src-supplier=Verical; ComponentLink1Description: https://datasheet.ciiva.com/18193/getdatasheetpartid-385649-18193413.pdf?src-supplier=Verical; ComponentLink2URL: https://datasheet.ciiva.com/7842/kem-c1002-x7r-smd-7842536.pdf?src-supplier=Element14; ComponentLink2Description: https://datasheet.ciiva.com/7842/kem-c1002-x7r-smd-7842536.pdf?src-supplier=Element14; ComponentLink3URL: https://datasheet.ciiva.com/7842/kem-c1002-x7r-smd-7842538.pdf?src-supplier=Element14; ComponentLink3Description: https://datasheet.ciiva.com/7842/kem-c1002-x7r-smd-7842538.pdf?src-supplier=Element14
footprint CAP0805
pins: 1, 2
